# Altium footprint library Dahlia Carrier Board.PcbLib: 99 footprints (part 5 of 7)
Each footprint in its own frame and in the unit in brackets; x right, y up, seen from the top. Pads: shape width x height; smd on the part's side, far side on the other; paste and mask are expansions set on the pad; w line width, h text height; cw(c..) or ccw(c..) is an arc to the next point about the centre after c.
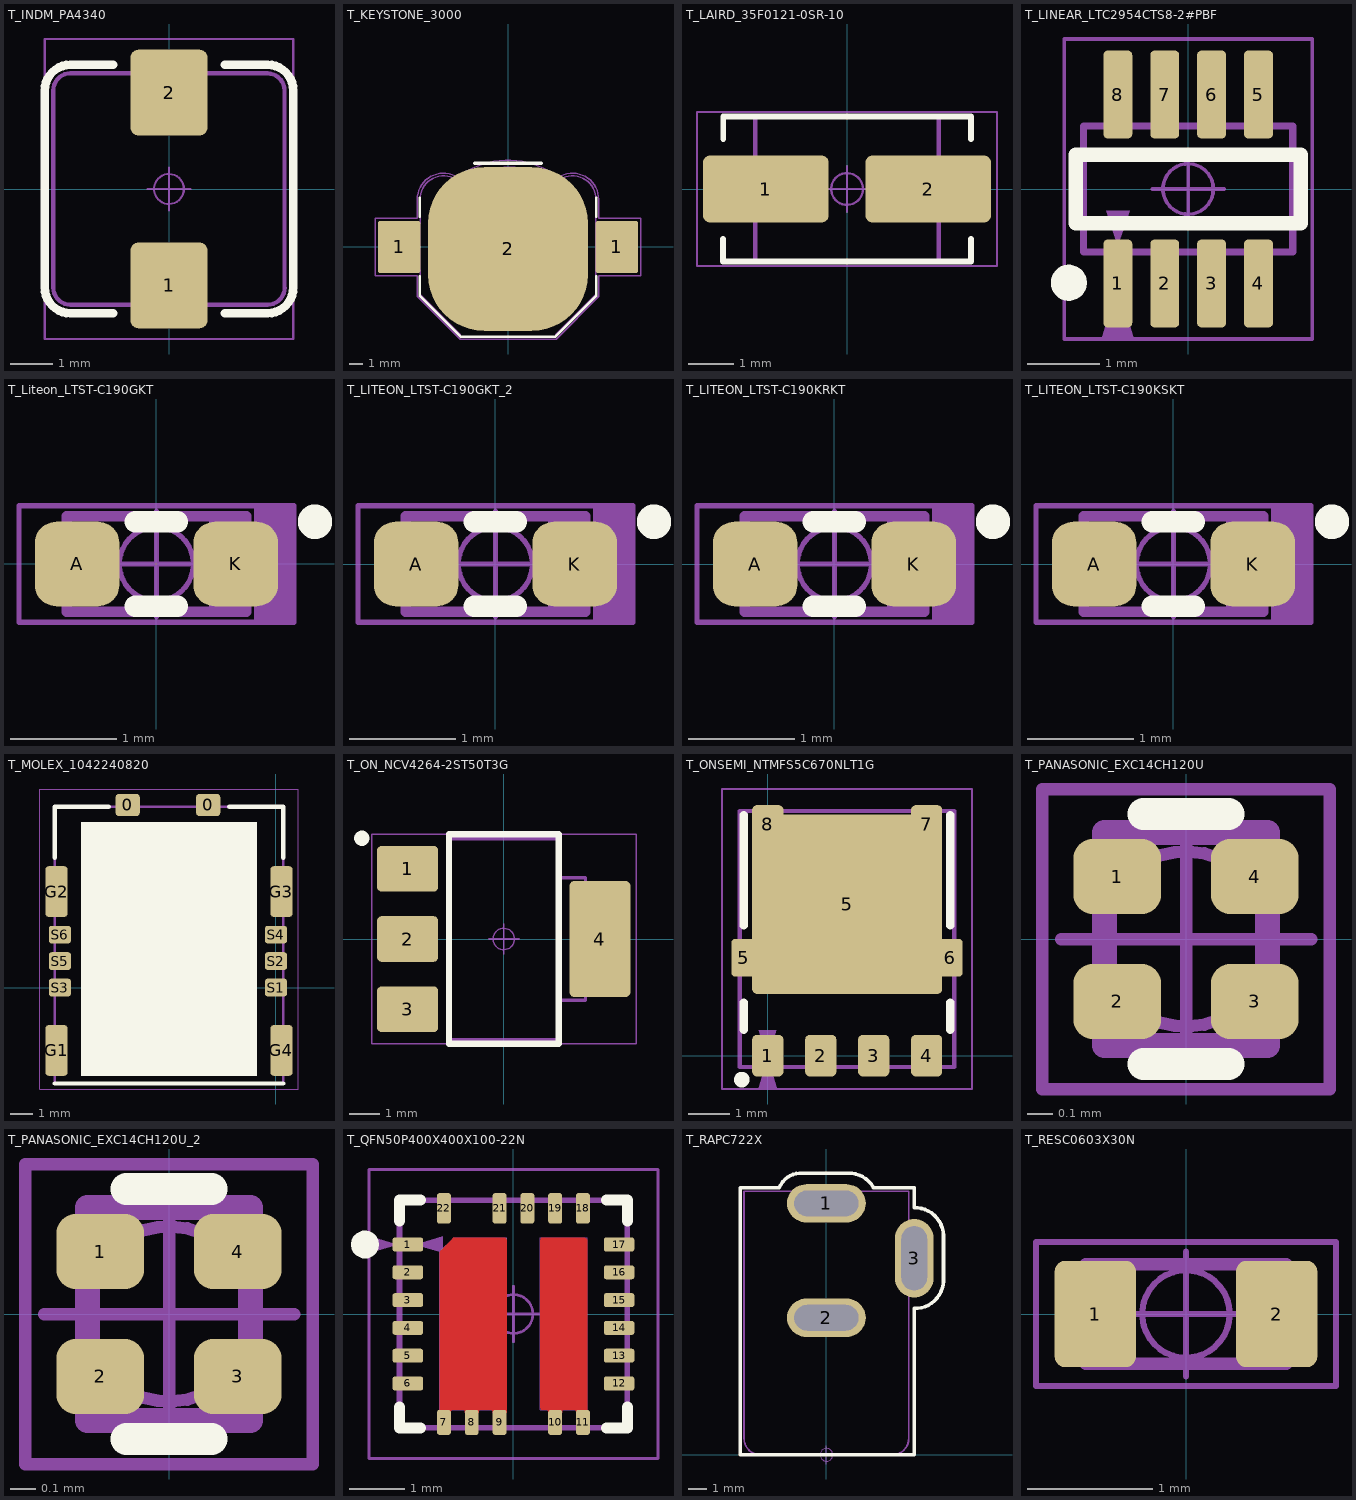
[diagram p4: the footprints below, top view; thin cyan lines are the x and y axes]

## T_INDM_PA4340 [mm]
pads (2):
  rrect20% 1.8x2 smd: 1(0,-2.25) 2(0,2.25)
Top Overlay:
  lines w0.2: -1.3,-2.9 -2.3,-2.9 cw(c-2.3,-2.3) -2.9,-2.3 -2.9,2.3 cw(c-2.3,2.3) -2.3,2.9 -1.3,2.9 ; 1.3,-2.9 2.3,-2.9 ccw(c2.3,-2.3) 2.9,-2.3 2.9,2.3 ccw(c2.3,2.3) 2.3,2.9 1.3,2.9
Top Component Outline:
  lines w0.05: -2.9,-3.5 -2.9,3.5 2.9,3.5 2.9,-3.5 -2.9,-3.5
Top 3D Body:
  lines w0.001: -0.75,3 cw(c-0.75,3) -0.75,3 ; -0.75,2.7 ccw(c-0.75,2.7) -0.75,2.7 ; -0.75,2.7 -2.3,2.7 ccw(c-2.3,2.3) -2.7,2.3 -2.7,-2.3 ccw(c-2.3,-2.3) -2.3,-2.7 -0.75,-2.7 -0.75,-3 0.75,-3 0.75,-2.7 ; -0.75,2.7 -0.75,3 ; -0.75,3 0.75,3 0.75,2.7 2.3,2.7 cw(c2.3,2.3) 2.7,2.3 2.7,-2.3 cw(c2.3,-2.3) 2.3,-2.7 0.75,-2.7 ; 0.75,-2.7 ccw(c0.75,-2.7) 0.75,-2.7
Top Dimensions:
  lines w0.1: -2.7,-2.302 ccw(c-2.3,-2.3) -2.302,-2.7 ; -2.7,-2.3 -2.7,2.3 ; -2.7,2.302 cw(c-2.3,2.3) -2.302,2.7 ; -2.3,-2.7 2.298,-2.7 ; -2.3,2.7 2.298,2.7 ; 2.298,2.696 cw(c2.296,2.296) 2.696,2.298 2.696,-2.302 ; 2.302,-2.7 ccw(c2.3,-2.3) 2.7,-2.302
Top Component Center:
  circle w0.05: c0,0 r0.35
  lines w0.05: -0.5,0 0.5,0 ; 0,-0.5 0,0.5
Top Assembly:
  text ".Designator" at -1.95,3.575 h0.75
3D body: height 1.5, standoff 0, extent -0.75,-3 0.75,-2
3D body: height 1.5, standoff 0, extent -0.75,2 0.75,3
3D body: height 3, standoff 0, extent -2.7,-2.7 2.7,2.7

## T_KEYSTONE_3000 [mm] "Battery Holder"
height 3.2
pads (3):
  rrect10% 3.2x3.9 smd: 1(-8.17,0) 1(8.17,0)
  rrect70% 12x12.3 smd paste-11: 2(0,-0.15)
Top Overlay:
  lines w0.2: -6.631,-2.21 -6.631,-3.638 -3.517,-6.752 3.523,-6.752 3.523,-6.746 6.631,-3.638 6.631,-2.21 ; -6.631,2.261 -6.631,3.689 ; 6.631,2.261 6.631,3.689
  lines w0.254: -2.5,6.3 2.5,6.3
Top Component Outline:
  lines w0.1: -6.808,3.568 cw(c-4.849,3.588) -3.782,5.231 ; -6.808,3.588 -6.808,2.159 -9.982,2.159 -9.982,-2.159 -6.807,-2.159 -6.807,-3.683 -3.581,-6.909 3.607,-6.909 6.833,-3.683 6.833,-2.159 9.982,-2.159 9.982,2.159 6.809,2.159 6.809,3.57 ; -3.785,5.233 cw(c0,0.323) 3.785,5.233 ; 3.782,5.231 cw(c4.849,3.588) 6.807,3.568
Top 3D Body:
  circle w0.001: c-8.185,0 r1.2
  circle w0.001: c8.185,0 r1.2
  circle w0.001: c0,0 r6
  lines w0.001: -6.605,-1.585 -9.46,-1.585 -9.46,1.585 -6.605,1.585 ; -6.605,3.588 -6.605,-3.57 -6.59,-3.57 -3.57,-6.59 -3.57,-6.725 3.57,-6.725 3.57,-6.59 6.59,-3.57 6.605,-3.57 6.605,3.588 ; -6.605,3.57 cw(c-4.849,3.588) -3.585,4.808 ccw(c0,9.619) 3.586,4.808 cw(c4.849,3.588) 6.605,3.57 ; -3.57,5.345 3.57,5.345 ; 6.605,-1.585 9.46,-1.585 9.46,1.585 6.605,1.585
Top Dimensions:
  lines w0.1: -6.605,-1.723 -6.605,-3.57 -6.59,-3.57 -3.57,-6.59 -3.57,-6.725 3.57,-6.725 3.57,-6.59 6.59,-3.57 6.605,-3.57 6.605,-1.723 ; -6.604,-1.723 -9.578,-1.723 -9.578,1.727 -6.605,1.727 -6.605,3.57 cw(c-4.849,3.588) -3.585,4.808 ccw(c0,9.619) 3.586,4.808 cw(c4.849,3.588) 6.605,3.57 ; 6.604,-1.724 9.575,-1.724 9.575,1.73 6.605,1.73 ; 6.605,1.727 6.605,3.57
Top Component Center:
  circle w0.05: c0,0 r0.35
  lines w0.05: -0.5,0 0.5,0 ; 0,-0.5 0,0.5
Top Assembly:
  text ".Designator" at -2,7 h0.75
3D body "keystone-PN3000.STEP": height 3.16, standoff -0.01, extent -9.474,-6.72 9.474,5.345

## T_LAIRD_35F0121-0SR-10 [mm]
height 5.5
pads (2):
  rrect20% 2.77x1.47 smd: 1(-1.79,0) 2(1.79,0)
Top Overlay:
  lines w0.127: -2.732,-1.102 -2.732,-1.599 2.73,-1.599 2.73,-1.104 ; -2.729,1.104 -2.729,1.599 2.73,1.599 2.73,1.104
Top Component Outline:
  lines w0.05: -3.306,-1.695 -3.306,1.695 3.305,1.695 3.305,-1.695 -3.306,-1.695
Top 3D Body:
  lines w0.001: -2.025,-1.6 -2.025,1.6 2.025,1.6 2.025,-1.6 -2.025,-1.6
Top Dimensions:
  lines w0.1: -2.025,-1.6 2.025,-1.6 2.025,1.6 -2.025,1.6 -2.025,-1.6
Top Component Center:
  circle w0.05: c0,0 r0.35
  lines w0.05: -0.5,0 0.5,0 ; 0,-0.5 0,0.5
Top Assembly:
  text ".Designator" at -1.575,2.025 h0.75
3D body "test-14.step": height 3.05, standoff 0, extent -2.3,-1.59 2.3,1.59

## T_LINEAR_LTC2954CTS8-2#PBF [mm]
height 5.5
pads (8):
  rrect30% 0.4x1.22 smd: 1(-0.975,-1.31) 2(-0.325,-1.31) 3(0.325,-1.31) 4(0.975,-1.31) 5(0.975,1.31) 6(0.325,1.31) 7(-0.325,1.31) 8(-0.975,1.31)
Top Overlay:
  circle w0.25: c-1.655,-1.3 r0.125
  lines w0.2: -1.56,-0.475 1.56,-0.475 1.56,0.475 -1.56,0.475 -1.56,-0.475
Top Component Outline:
  region: -0.762,-2.05 -0.975,-1.34 -1.188,-2.05
  lines w0.05: -1.72,-2.08 1.72,-2.08 ; -1.72,-2.07 -1.72,2.08 1.72,2.08 1.72,-2.07
Top 3D Body:
  lines w0.001: -1.45,-0.875 -1.45,0.875 1.45,0.875 1.45,-0.875 -1.45,-0.875
Top Dimensions:
  region: -0.975,-0.785 -1.137,-0.3 -0.813,-0.3
  lines w0.1: -1.45,-0.875 -1.45,0.875 1.45,0.875 1.45,-0.875 -1.45,-0.875
Top Component Center:
  circle w0.05: c0,0 r0.35
  lines w0.05: -0.5,0 0.5,0 ; 0,-0.5 0,0.5
Top Assembly:
  text ".Designator" at -1.905,2.388 h0.75
3D body "test-15.step": height 1, standoff 0, extent -1.45,-1.4 1.45,1.4

## T_Liteon_LTST-C190GKT [mm]
pads (2):
  rrect50% 0.8x0.8 smd: A(-0.75,0) K(0.75,0)
Top Overlay:
  circle w0.25: c1.5,0.4 r0.038
  lines w0.2: -0.2,-0.4 0.2,-0.4 ; -0.2,0.4 0.2,0.4
Top Component Outline:
  rectangle: 0.925,-0.55 1.3,0.55
  lines w0.05: -1.3,-0.55 -1.3,0.55 1.3,0.55 1.3,-0.55 -1.3,-0.55
Top 3D Body:
  lines w0.001: -0.85,-0.45 0.85,-0.45 0.85,0.45 -0.85,0.45 -0.85,-0.45
Top Dimensions:
  rectangle: 0.499,-0.45 0.849,0.45
  lines w0.1: -0.85,-0.45 0.85,-0.45 0.85,0.45 -0.85,0.45 -0.85,-0.45
Top Component Center:
  circle w0.05: c0,0 r0.35
  lines w0.05: -0.5,0 0.5,0 ; 0,-0.5 0,0.5
Top Assembly:
  text ".Designator" at -0.575,-0.2 h0.75
3D body "User Library-LTST-C190GKT.STEP": height 0.9, standoff 0, extent -0.85,-0.45 0.85,0.45

## T_LITEON_LTST-C190GKT_2 [mm]
pads (2):
  rrect50% 0.8x0.8 smd: A(-0.75,0) K(0.75,0)
Top Overlay:
  circle w0.25: c1.5,0.4 r0.038
  lines w0.2: -0.2,-0.4 0.2,-0.4 ; -0.2,0.4 0.2,0.4
Top Component Outline:
  rectangle: 0.925,-0.55 1.3,0.55
  lines w0.05: -1.3,-0.55 1.3,-0.55 1.3,0.55 -1.3,0.55 -1.3,-0.55
Top 3D Body:
  lines w0.001: -0.85,-0.45 -0.85,0.45 0.85,0.45 0.85,-0.45 -0.85,-0.45
Top Dimensions:
  rectangle: 0.499,-0.45 0.849,0.45
  lines w0.1: -0.85,-0.45 -0.85,0.45 0.85,0.45 0.85,-0.45 -0.85,-0.45
Top Component Center:
  circle w0.05: c0,0 r0.35
  lines w0.05: -0.5,0 0.5,0 ; 0,-0.5 0,0.5
Top Assembly:
  text ".Designator" at -1.125,-0.2 h0.75
3D body "User Library-LTST-C190GKT.STEP": height 0.9, standoff 0, extent -0.85,-0.45 0.85,0.45

## T_LITEON_LTST-C190KRKT [mm]
pads (2):
  rrect50% 0.8x0.8 smd: A(-0.75,0) K(0.75,0)
Top Overlay:
  circle w0.25: c1.5,0.4 r0.038
  lines w0.2: -0.2,-0.4 0.2,-0.4 ; -0.2,0.4 0.2,0.4
Top Component Outline:
  rectangle: 0.925,-0.55 1.3,0.55
  lines w0.05: -1.3,-0.55 -1.3,0.55 1.3,0.55 1.3,-0.55 -1.3,-0.55
Top 3D Body:
  lines w0.001: -0.85,-0.45 -0.85,0.45 0.85,0.45 0.85,-0.45 -0.85,-0.45
Top Dimensions:
  rectangle: 0.499,-0.45 0.849,0.45
  lines w0.1: -0.85,-0.45 -0.85,0.45 0.85,0.45 0.85,-0.45 -0.85,-0.45
Top Component Center:
  circle w0.05: c0,0 r0.35
  lines w0.05: -0.5,0 0.5,0 ; 0,-0.5 0,0.5
Top Assembly:
  text ".Designator" at -0.575,-0.2 h0.75
3D body "User Library-LTST-C190EKT.STEP": height 0.9, standoff 0, extent -0.85,-0.45 0.85,0.45

## T_LITEON_LTST-C190KSKT [mm]
pads (2):
  rrect50% 0.8x0.8 smd: A(-0.75,0) K(0.75,0)
Top Overlay:
  circle w0.25: c1.5,0.4 r0.038
  lines w0.2: -0.2,-0.4 0.2,-0.4 ; -0.2,0.4 0.2,0.4
Top Component Outline:
  rectangle: 0.925,-0.55 1.3,0.55
  lines w0.05: -1.3,-0.55 1.3,-0.55 1.3,0.55 -1.3,0.55 -1.3,-0.55
Top 3D Body:
  lines w0.001: -0.85,-0.45 -0.85,0.45 0.85,0.45 0.85,-0.45 -0.85,-0.45
Top Dimensions:
  rectangle: 0.499,-0.45 0.849,0.45
  lines w0.1: -0.85,-0.45 -0.85,0.45 0.85,0.45 0.85,-0.45 -0.85,-0.45
Top Component Center:
  circle w0.05: c0,0 r0.35
  lines w0.05: -0.5,0 0.5,0 ; 0,-0.5 0,0.5
Top Assembly:
  text ".Designator" at -1.05,-0.225 h0.75
3D body "User Library-LTST-C190SKT_YELLOW.STEP": height 0.9, standoff 0, extent -0.85,-0.45 0.85,0.45

## T_MOLEX_1042240820 [mm]
height 1.21
pads (12):
  rrect30% 1.1x1 smd paste+0: 0(-6.725,8.275) 0(-3.075,8.275)
  rrect30% 1x2.3 smd paste+0: G1(-9.95,-2.85) G2(-9.95,4.35) G3(0.25,4.35) G4(0.25,-2.85)
  rrect30% 1x0.8 smd: S1(0,0) S2(0,1.2) S3(-9.8,0) S4(0,2.4) S5(-9.8,1.2) S6(-9.8,2.4)
Top Layer keep-out:
  rectangle: -5.425,3.3 -4.225,6.4
  rectangle: -7.975,3.3 -6.775,6.4
  rectangle: -2.875,3.3 -1.675,6.4
  rectangle: -2.9,-4 -1.7,-1.1
  rectangle: -8,-4 -6.8,-1.1
  rectangle: -5.45,-4 -4.25,-1.1
Top Overlay:
  rectangle: -8.85,-4 -0.85,7.5
  lines w0.2: -10.025,-4.35 0.325,-4.35 ; -10.025,5.875 -10.025,8.2 -7.575,8.2 ; -2.125,8.2 0.325,8.2 0.325,5.875
Top Component Outline:
  lines w0.05: -10.7,-4.6 -10.7,9 1,9 1,-4.6 -10.7,-4.6
Top 3D Body:
  lines w0.001: -10.025,-4.35 0.325,-4.35 0.325,8.2 -10.025,8.2 -10.025,-4.35
Top Dimensions:
  lines w0.1: -10.025,-4.35 0.325,-4.35 0.325,8.2 -10.025,8.2 -10.025,-4.35
Top Component Center:
  circle w0.05: c-4.825,1.8 r0.35
  lines w0.05: -5.325,1.8 -4.325,1.8 ; -4.825,1.3 -4.825,2.3
Top Assembly:
  text ".Designator" at -5.125,1 h0.75
3D body "1042240820.stp": height 1.1, standoff -0.01, extent -10.025,-4.35 0.325,8.2

## T_ON_NCV4264-2ST50T3G [mm]
height 13.83
pads (4):
  rrect20% 2x1.5 smd: 1(-3.15,2.3) 2(-3.15,0) 3(-3.15,-2.3)
  rrect15% 2x3.8 smd: 4(3.15,0)
Top Overlay:
  circle w0.25: c-4.65,3.3 r0.125
  lines w0.2: -1.8,-3.43 1.8,-3.43 1.8,3.43 -1.8,3.43 -1.8,-3.43
Top Component Outline:
  lines w0.05: -4.33,-3.43 4.33,-3.43 4.33,3.43 -4.33,3.43 -4.33,-3.43
Top 3D Body:
  lines w0.001: -1.85,-3.251 -1.85,3.251 1.85,3.251 1.85,-3.251 -1.85,-3.251
Top Dimensions:
  lines w0.1: 1.79,-2.006 2.68,-2.006 2.68,2.006 1.79,2.006 ; -1.85,-3.302 1.79,-3.302 1.79,3.302 -1.85,3.302 -1.85,-3.302
Top Component Center:
  circle w0.05: c0,0 r0.35
  lines w0.05: -0.5,0 0.5,0 ; 0,-0.5 0,0.5
Top Assembly:
  text ".Designator" at -1.807,3.912 h0.75
3D body "User Library-SOT223-3.step": height 1.7, standoff 0, extent -3.5,-3.25 3.5,3.25

## T_ONSEMI_NTMFS5C670NLT1G [mm]
pads (9):
  rrect30% 0.75x1 smd paste+0: 1(0,0) 2(1.27,0) 3(2.54,0) 4(3.81,0)
  rrect30% 0.6x0.905 smd paste+0: 5(-0.575,2.35) 6(4.375,2.35)
  rrect5% 4.56x4.3 smd paste-0.9: 5(1.905,3.635)
  rrect30% 0.75x0.905 smd paste+0: 7(3.81,5.56) 8(0,5.56)
Top Overlay:
  circle w0.3: c-0.625,-0.575 r0.035
  lines w0.2: -0.575,0.625 -0.575,1.275 ; -0.575,3.125 -0.575,5.775 ; 4.375,0.625 4.375,1.275 ; 4.375,3.125 4.375,5.775
Top Component Outline:
  region: 0.213,-0.775 0,-0.065 -0.213,-0.775
  lines w0.05: -1.1,-0.8 4.9,-0.8 4.9,6.4 -1.1,6.4 -1.1,-0.8
Top Dimensions:
  region: -0.219,0.605 -0.007,-0.105 0.207,0.605
  lines w0.1: -0.675,-0.275 -0.675,5.875 4.475,5.875 4.475,-0.275 -0.675,-0.275
Top Component Center:
  circle w0.05: c1.9,2.8 r0.35
  lines w0.05: 1.4,2.8 2.4,2.8 ; 1.9,2.3 1.9,3.3
Top Assembly:
  text ".Designator" at 1.375,2.625 h0.75
3D body "NTMFS6B03NT1G--3DModel-STEP-56544.STEP": height 1.1, standoff 0, extent -0.67,-0.277 4.48,5.873

## T_PANASONIC_EXC14CH120U [mm]
height 0.45
pads (4):
  rrect50% 0.35x0.3 smd: 1(-0.275,0.25) 2(-0.275,-0.25) 3(0.275,-0.25) 4(0.275,0.25)
Top Overlay:
  lines w0.127: -0.17,-0.5 0.17,-0.5 ; -0.17,0.5 0.17,0.5
Top Component Outline:
  lines w0.05: -0.575,-0.6 -0.575,0.6 0.575,0.6 0.575,-0.6 -0.575,-0.6
Top 3D Body:
  lines w0.01: -0.325,-0.425 0.325,-0.425 0.325,0.425 -0.325,0.425 -0.325,-0.425
Top Dimensions:
  lines w0.1: -0.325,-0.425 -0.325,0.425 0.325,0.425 0.325,-0.425 -0.325,-0.425
Top Component Center:
  circle w0.05: c0,0 r0.35
  lines w0.05: -0.5,0 0.5,0 ; 0,-0.5 0,0.5
Top Assembly:
  text ".Designator" at -0.3,-0.175 h0.6
3D body: height 0.45, standoff 0, extent -0.324,-0.424 0.324,0.424

## T_PANASONIC_EXC14CH120U_2 [mm]
pads (4):
  rrect50% 0.35x0.3 smd: 1(-0.275,0.25) 2(-0.275,-0.25) 3(0.275,-0.25) 4(0.275,0.25)
Top Overlay:
  lines w0.127: -0.17,-0.5 0.17,-0.5 ; -0.17,0.5 0.17,0.5
Top Component Outline:
  lines w0.05: -0.575,-0.6 -0.575,0.6 0.575,0.6 0.575,-0.6 -0.575,-0.6
Top 3D Body:
  lines w0.01: -0.325,-0.425 0.325,-0.425 0.325,0.425 -0.325,0.425 -0.325,-0.425
Top Dimensions:
  lines w0.1: -0.325,-0.425 -0.325,0.425 0.325,0.425 0.325,-0.425 -0.325,-0.425
Top Component Center:
  circle w0.05: c0,0 r0.35
  lines w0.05: -0.5,0 0.5,0 ; 0,-0.5 0,0.5
Top Assembly:
  text ".Designator" at -0.3,-0.175 h0.6
3D body: height 0.45, standoff 0, extent -0.324,-0.424 0.324,0.424

## T_QFN50P400X400X100-22N [mm]
pads (22):
  rrect35% 0.55x0.25 smd: 1(-1.9,1.25) 2(-1.9,0.75) 3(-1.9,0.25) 4(-1.9,-0.25) 5(-1.9,-0.75) 6(-1.9,-1.25) 12(1.9,-1.25) 13(1.9,-0.75) 14(1.9,-0.25) 15(1.9,0.25) 16(1.9,0.75) 17(1.9,1.25)
  rrect35% 0.25x0.45 smd: 7(-1.25,-1.95) 8(-0.75,-1.95) 9(-0.25,-1.95) 10(0.75,-1.95) 11(1.25,-1.95)
  rrect35% 0.25x0.55 smd: 18(1.25,1.9) 19(0.75,1.9) 20(0.25,1.9) 21(-0.25,1.9) 22(-1.25,1.9)
Top Layer:
  region: 0.525,1.375 0.516,1.375 0.5,1.368 0.487,1.356 0.48,1.339 0.48,1.33 0.48,-1.68 0.48,-1.689 0.487,-1.706 0.499,-1.718 0.516,-1.725 0.525,-1.725 0.6,-1.725 0.605,-1.725 0.614,-1.729 0.621,-1.736 0.625,-1.745 0.625,-1.75 0.625,-1.775 0.875,-1.775 0.875,-1.75 0.875,-1.745 0.879,-1.736 0.886,-1.729 0.895,-1.725 0.9,-1.725 1.1,-1.725 1.105,-1.725 1.114,-1.729 1.121,-1.736 1.125,-1.745 1.125,-1.75 1.125,-1.8 1.255,-1.8 1.27,-1.8 1.297,-1.789 1.319,-1.767 1.33,-1.74 1.33,-1.725 1.33,1.32 1.33,1.331 1.322,1.351 1.306,1.367 1.286,1.375 1.275,1.375
  region: -1.3,1.15 -1.307,1.143 -1.318,1.126 -1.326,1.107 -1.33,1.088 -1.33,1.078 -1.33,-1.875 -1.125,-1.875 -1.125,-1.75 -1.125,-1.745 -1.121,-1.736 -1.114,-1.729 -1.105,-1.725 -1.1,-1.725 -0.9,-1.725 -0.895,-1.725 -0.886,-1.729 -0.879,-1.736 -0.875,-1.745 -0.875,-1.75 -0.875,-1.775 -0.625,-1.775 -0.625,-1.75 -0.625,-1.745 -0.621,-1.736 -0.614,-1.729 -0.605,-1.725 -0.6,-1.725 -0.4,-1.725 -0.395,-1.725 -0.386,-1.729 -0.379,-1.736 -0.375,-1.745 -0.375,-1.75 -0.375,-1.775 -0.125,-1.775 -0.125,1.325 -0.125,1.335 -0.133,1.353 -0.147,1.367 -0.165,1.375 -0.175,1.375 -1.05,1.375 -1.056,1.375 -1.068,1.373 -1.079,1.368 -1.088,1.362 -1.093,1.357
Top Overlay:
  circle w0.25: c-2.671,1.25 r0.125
  lines w0.2: -2.05,-1.676 -2.05,-2.05 -1.676,-2.05 ; -2.05,1.676 -2.05,2.05 -1.676,2.05 ; 1.676,-2.05 2.05,-2.05 2.05,-1.676 ; 1.676,2.05 2.05,2.05 2.05,1.676
Top Paste:
  region: -0.975,1.125 -1.075,1.025 -1.075,-1.475 -0.375,-1.475 -0.375,1.125
  region: 0.7,1.15 1.125,1.15 1.125,-1.5 0.7,-1.5
Top Component Outline:
  region: -2.578,1.1 -2.078,1.25 -2.578,1.4
  lines w0.05: -2.6,-2.6 -2.6,2.6 2.6,2.6 2.6,-2.6 -2.6,-2.6
Top 3D Body:
  lines w0.001: -1.325,1.345 -1.325,1.375 -1.295,1.375 ; -2.05,-2.05 -2.05,2.05 2.05,2.05 2.05,-2.05 -2.05,-2.05 ; -1.325,-1.725 -0.125,-1.725 -0.125,1.375 -1.068,1.375 -1.325,1.118 -1.325,-1.725 ; 0.48,-1.725 0.48,1.375 1.33,1.375 1.33,-1.725 0.48,-1.725
Top Dimensions:
  region: -1.273,1.4 -1.773,1.25 -1.273,1.1
  lines w0.1: -2.05,-2.05 -2.05,2.05 2.05,2.05 2.05,-2.05 -2.05,-2.05
Top Component Center:
  circle w0.05: c0,0 r0.35
  lines w0.05: -0.5,0 0.5,0 ; 0,-0.5 0,0.5
Top Assembly:
  text ".Designator" at -1.75,2.9 h0.75
3D body "test-18.step": height 1, standoff 0, extent -2.051,-2.051 2.051,2.051

## T_RAPC722X [mm] "Connector, 2.1mm (Dia), 5.5mm(Dia), Round Power Socket"
height 10.7
pads (3):
  oval 4.3x2.1 hole 1.4 slot 3.5 at 0 deg: 1(0,13.74) 2(0,7.49)
  oval 2.1x4.3 hole 1.4 slot 3.5 at 90 deg: 3(4.8,10.74)
Top Overlay:
  lines w0.2: 1.196,15.393 -1.3,15.393 ccw(c-1.385,14.115) -2.569,14.6 -4.7,14.6 -4.7,0 4.79,0 4.79,8 ccw(c4.843,9.553) 6.396,9.499 6.396,11.996 ccw(c4.841,11.945) 4.79,13.5 4.79,14.59 4.78,14.6 2.569,14.6 ccw(c1.234,13.866) 1.2,15.388
Top Component Outline:
  lines w0.05: -1.332,15.393 1.164,15.393 ; -1.332,15.394 ccw(c-1.384,14.115) -2.568,14.6 -4.7,14.6 -4.7,0 4.8,0 4.8,8 ccw(c4.843,9.553) 6.396,9.499 6.396,11.996 ccw(c4.841,11.945) 4.8,13.5 4.8,14.6 2.568,14.6 ; 1.169,15.388 cw(c1.203,13.866) 2.537,14.6
Top 3D Body:
  lines w0.001: 3.6,0 -3.6,0 cw(c-3.6,0.9) -4.5,0.9 -4.5,14.4 1.4,14.4 4.5,14.4 4.5,0.9 cw(c3.6,0.9) 3.6,0
Top Dimensions:
  lines w0.1: -4.5,0.9 ccw(c-3.6,0.9) -3.6,0 3.6,0 ccw(c3.6,0.9) 4.5,0.9 4.5,14.4 -4.5,14.4 -4.5,0.9
Top Component Center:
  circle w0.05: c0,0 r0.35
  lines w0.05: -0.5,0 0.5,0 ; 0,-0.5 0,0.5
Top Assembly:
  text ".Designator" at -1.5,10.5 h0.75
3D body "User Library-rapc722.STEP": height 10.92, standoff -3.56, extent -4.5,-0.202 5.025,14.403

## T_RESC0603X30N [mm]
pads (2):
  rrect25% 0.65x0.85 smd: 1(-0.725,0) 2(0.725,0)
Top Component Outline:
  lines w0.05: -1.2,-0.575 1.2,-0.575 1.2,0.575 -1.2,0.575 -1.2,-0.575
Top 3D Body:
  lines w0.001: -0.8,-0.4 0.8,-0.4 0.8,0.4 -0.8,0.4 -0.8,-0.4
Top Dimensions:
  lines w0.1: -0.8,-0.4 0.8,-0.4 0.8,0.4 -0.8,0.4 -0.8,-0.4
Top Component Center:
  circle w0.05: c0,0 r0.35
  lines w0.05: -0.5,0 0.5,0 ; 0,-0.5 0,0.5
Top Assembly:
  text ".Designator" at 0.675,0.275 h0.75
3D body "User Library-RES_1609-0603.step": height 0.56, standoff 0, extent -0.85,-0.4 0.85,0.4